# Altium footprint library ICs.PcbLib: 86 footprints (part 2 of 6)
Each footprint in its own frame and in the unit in brackets; x right, y up, seen from the top. Pads: shape width x height; smd on the part's side, far side on the other; paste and mask are expansions set on the pad; w line width, h text height; cw(c..) or ccw(c..) is an arc to the next point about the centre after c.
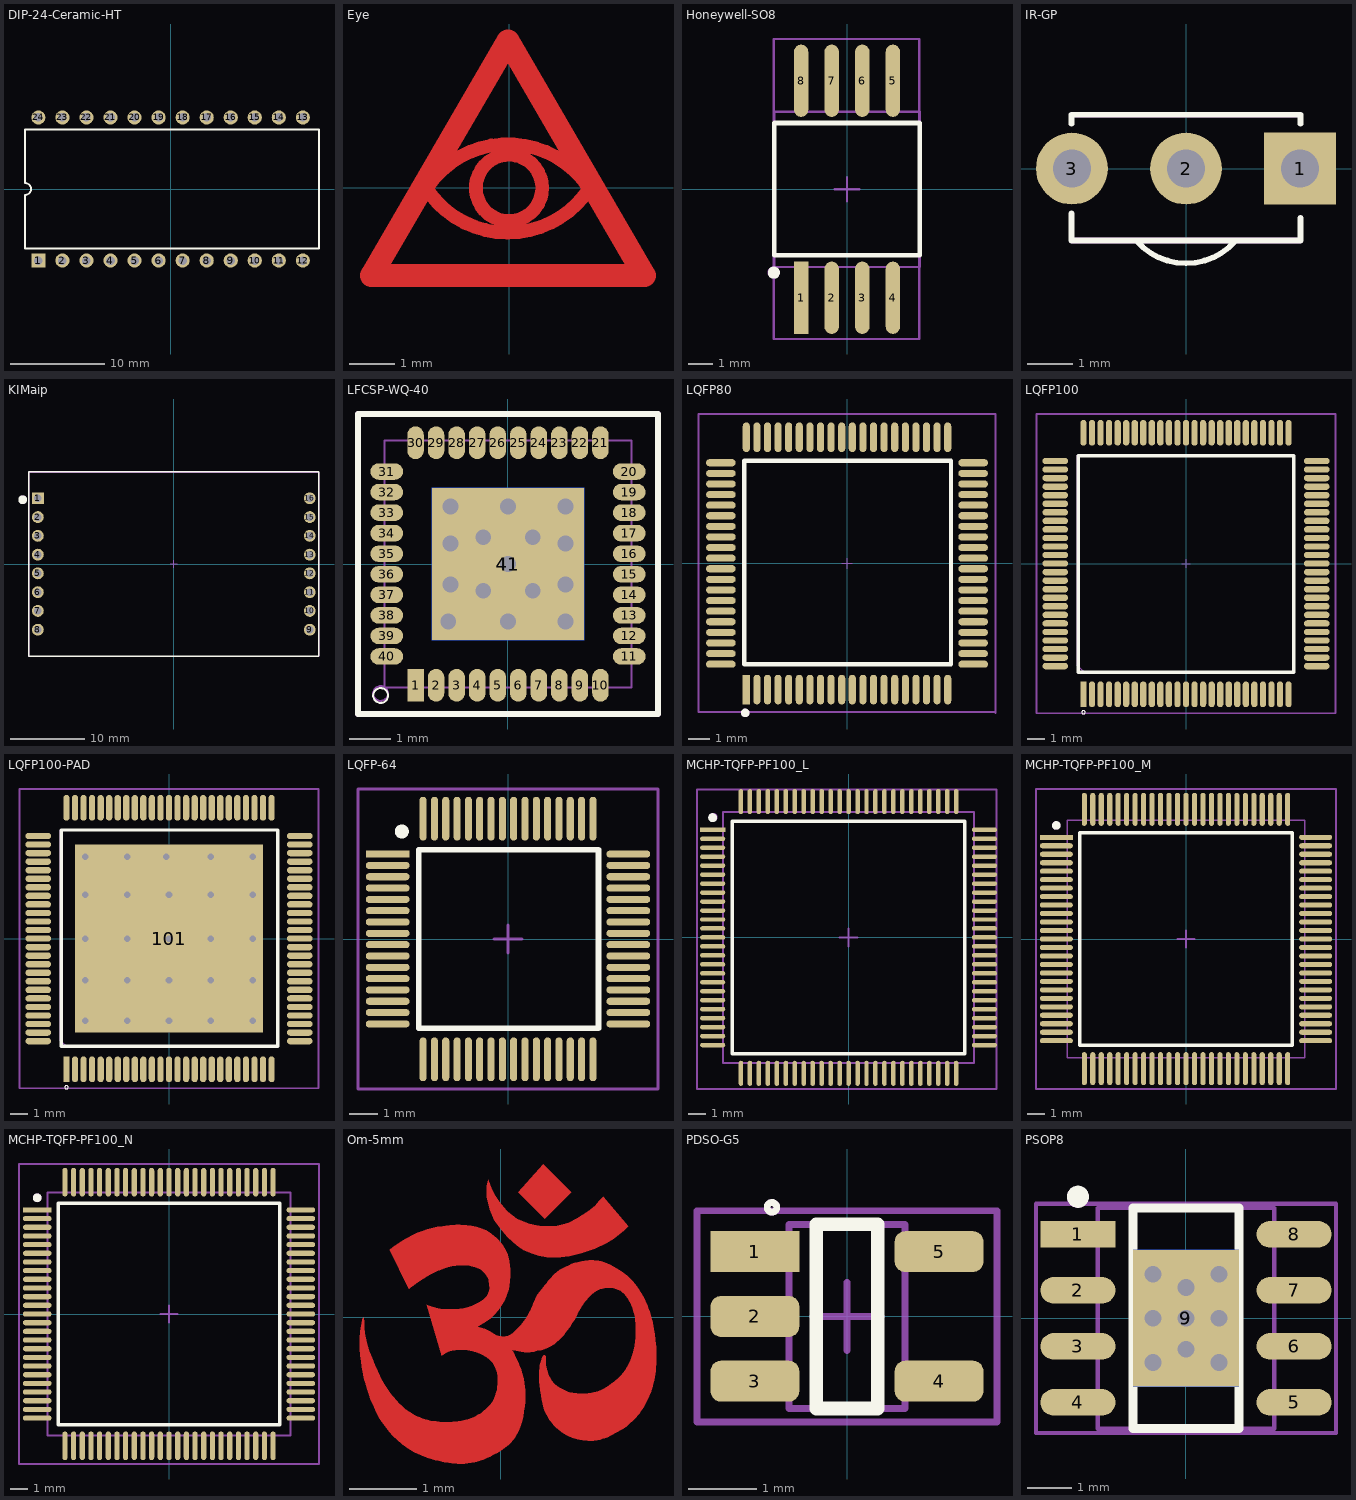
[diagram p1: the footprints below, top view; thin cyan lines are the x and y axes]

## DIP-24-Ceramic-HT [mm] "DIP; 24 Leads; Row Spacing 7.62 mm; Pitch 2.54 mm"
height 5.08
pads (24):
  rect 1.5x1.5 hole 0.9: 1(-13.97,-7.555)
  round 1.5 hole 0.9: 2(-11.43,-7.555) 3(-8.89,-7.555) 4(-6.35,-7.555) 5(-3.81,-7.555) 6(-1.27,-7.555) 7(1.27,-7.555) 8(3.81,-7.555) 9(6.35,-7.555) 10(8.89,-7.555) 11(11.43,-7.555) 12(13.97,-7.555) 13(13.97,7.555) 14(11.43,7.555) 15(8.89,7.555) 16(6.35,7.555) 17(3.81,7.555) 18(1.27,7.555) 19(-1.27,7.555) 20(-3.81,7.555) 21(-6.35,7.555) 22(-8.89,7.555) 23(-11.43,7.555) 24(-13.97,7.555)
Top Overlay:
  lines w0.2: -15.38,-0.665 -15.38,-6.27 15.675,-6.27 15.675,6.275 -15.38,6.275 -15.38,0.65 ; -15.38,-0.635 ccw(c-15.38,0) -15.38,0.635
3D body "dip24_6.stp": height 6, standoff -2.38, extent -16.486,-8.032 16.546,8.032

## Eye [mm]
Top Layer:
  circle w0.3: c-0.005,-0.005 r0.728
  lines w0.3: -1.862,0.058 ccw(c-0.03,1.138) 1.792,0.042 ; -1.796,0.014 cw(c-0.03,-1.17) 1.74,0.007
  lines w0.5: -3.03,-1.93 -0.025,3.225 2.97,-1.93 -3.03,-1.93
Top Solder:
  circle w0.3: c0,-0.03 r0.728
  lines w0.3: -1.857,0.033 ccw(c-0.025,1.113) 1.797,0.017 ; -1.791,-0.011 cw(c-0.025,-1.195) 1.745,-0.018
  lines w0.55: -3.025,-1.955 2.975,-1.955 -0.02,3.2 -3.025,-1.955

## Honeywell-SO8 [mm] "Honeywell-SO8"
height 1.75
pads (8):
  rect 0.6x3 smd: 1(-1.905,-4.5)
  oval 0.6x3 smd: 2(-0.635,-4.5) 3(0.635,-4.5) 4(1.905,-4.5) 5(1.905,4.5) 6(0.635,4.5) 7(-0.635,4.5) 8(-1.905,4.5)
Top Overlay:
  circle w0.25: c-3.035,-3.46 r0.125
  lines w0.2: -3.02,-2.735 -3.02,2.745 3.02,2.745 3.02,-2.735 -3.02,-2.735
Mechanical 1:
  circle w0.1: c-3.045,-3.45 r0.2
  lines w0.1: -3.02,-3.225 -3.02,3.22 3.01,3.22 3.01,-3.225 -3.02,-3.225
Mechanical 15:
  lines w0.1: -0.5,0 0.5,0 ; 0,-0.5 0,0.5 ; -3.045,-6.21 -3.045,6.23 2.995,6.23 2.995,-6.21 -3.045,-6.21
3D body: height 3, standoff 1, extent -3.035,-3.205 2.995,3.215

## IR-GP [mm]
height 7.5
pads (3):
  rect 1.6x1.6 hole 0.85: 1(2.54,0)
  round 1.6 hole 0.85: 2(0,0) 3(-2.54,0)
Top Overlay:
  lines w0.127: -2.55,-1 -2.55,-1.6 2.55,-1.6 2.55,-1.1 ; -2.55,1 -2.55,1.2 2.55,1.2 2.55,1 ; -1.11,-1.6 ccw(c0,-0.64) 1.11,-1.6
Mechanical 1:
  lines w0.127: -2.54,-1.6 2.54,-1.6 ; -2.54,1.2 2.54,1.2
3D body: height 8, standoff 0.5, extent -2.54,-1.6 2.54,1.2

## KIMaip [mm]
height 8.5
pads (16):
  rect 1.6x1.6 hole 1: 1(-18.4,8.89)
  round 1.6 hole 1: 2(-18.4,6.35) 3(-18.4,3.81) 4(-18.4,1.27) 5(-18.4,-1.27) 6(-18.4,-3.81) 7(-18.4,-6.35) 8(-18.4,-8.89) 9(18.4,-8.89) 10(18.4,-6.35) 11(18.4,-3.81) 12(18.4,-1.27) 13(18.4,1.27) 14(18.4,3.81) 15(18.4,6.35) 16(18.4,8.89)
Top Overlay:
  circle w0.6: c-20.45,8.7 r0.3
  lines w0.2: 19.6,-12.5 -19.6,-12.5 -19.6,12.5 19.6,12.5 19.6,-12.45
Mechanical 13:
  circle w0.1: c-20.45,8.7 r0.5
  lines w0.1: -19.6,-12.5 -19.6,12.5 19.6,12.5 19.6,-12.5 -19.6,-12.5
Mechanical 15:
  lines w0.1: -0.5,0 0.5,0 ; 0,-0.5 0,0.5 ; -19.55,-12.5 -19.55,12.45 19.65,12.45 19.65,-12.5 -19.55,-12.5
3D body: height 3, standoff 0, extent 17.2,-12.55 19.55,12.5
3D body: height 3, standoff 0, extent -19.6,-12.5 -17.25,12.55
3D body: height 8.5, standoff 3, extent -19.6,-12.5 19.6,12.55

## LFCSP-WQ-40 [mm]
height 0.8
pads (42):
  rect 0.4x0.8 smd: 1(-2.25,-2.95)
  oval 0.4x0.8 smd: 2(-1.75,-2.95) 3(-1.25,-2.95) 4(-0.75,-2.95) 5(-0.25,-2.95) 6(0.25,-2.95) 7(0.75,-2.95) 8(1.25,-2.95) 9(1.75,-2.95) 10(2.25,-2.95) 21(2.25,2.95) 22(1.75,2.95) 23(1.25,2.95) 24(0.75,2.95) 25(0.25,2.95) 26(-0.25,2.95) 27(-0.75,2.95) 28(-1.25,2.95) 29(-1.75,2.95) 30(-2.25,2.95)
  oval 0.8x0.4 smd: 11(2.95,-2.25) 12(2.95,-1.75) 13(2.95,-1.25) 14(2.95,-0.75) 15(2.95,-0.25) 16(2.95,0.25) 17(2.95,0.75) 18(2.95,1.25) 19(2.95,1.75) 20(2.95,2.25) 31(-2.95,2.25) 32(-2.95,1.75) 33(-2.95,1.25) 34(-2.95,0.75) 35(-2.95,0.25) 36(-2.95,-0.25) 37(-2.95,-0.75) 38(-2.95,-1.25) 39(-2.95,-1.75) 40(-2.95,-2.25)
  rect 3.7x3.7 smd: 41(0,0)
  rect 3.7x3.7 smd far side: 41(0,0)
via 0,0 diameter 0.6 hole 0.381
via -1.4,1.4 diameter 0.6 hole 0.381
via -1.45,-1.4 diameter 0.6 hole 0.381
via 1.4,1.4 diameter 0.6 hole 0.381
via 1.4,-1.4 diameter 0.6 hole 0.381
via 0,-1.4 diameter 0.6 hole 0.381
via 1.4,-0.5 diameter 0.6 hole 0.381
via 0,1.4 diameter 0.6 hole 0.381
via 1.4,0.5 diameter 0.6 hole 0.381
via -1.4,-0.5 diameter 0.6 hole 0.381
via -1.4,0.5 diameter 0.6 hole 0.381
via -0.6,-0.65 diameter 0.6 hole 0.381
via -0.6,0.65 diameter 0.6 hole 0.381
via 0.6,0.65 diameter 0.6 hole 0.381
via 0.6,-0.65 diameter 0.6 hole 0.381
Top Overlay:
  circle w0.05: c-3.1,-3.2 r0.18
  lines w0.15: -3.65,-3.65 -3.65,3.65 3.65,3.65 3.65,-3.65 -3.65,-3.65
Mechanical 1:
  lines w0.05: -3,-3 -3,3 3,3 3,-3 -3,-3
Mechanical 15:
  circle w0.05: c-3.1,-3.15 r0.18
  lines w0.05: -0.5,0 0.5,0 ; 0,-0.5 0,0.5
  lines w0.15: -3.65,-3.65 3.65,-3.65 3.65,3.65 -3.65,3.65 -3.65,-3.65
3D body: height 0.8, standoff 0, extent -3,-3 3,3

## LQFP80 [mm]
pads (80):
  rect 0.335x1.4 smd: 1(-4.75,-5.95)
  oval 0.335x1.4 smd: 2(-4.25,-5.95) 3(-3.75,-5.95) 4(-3.25,-5.95) 5(-2.75,-5.95) 6(-2.25,-5.95) 7(-1.75,-5.95) 8(-1.25,-5.95) 9(-0.75,-5.95) 10(-0.25,-5.95) 11(0.25,-5.95) 12(0.75,-5.95) 13(1.25,-5.95) 14(1.75,-5.95) 15(2.25,-5.95) 16(2.75,-5.95) 17(3.25,-5.95) 18(3.75,-5.95) 19(4.25,-5.95) 20(4.75,-5.95) 41(4.75,5.95) 42(4.25,5.95) 43(3.75,5.95) 44(3.25,5.95) 45(2.75,5.95) 46(2.25,5.95) 47(1.75,5.95) 48(1.25,5.95) 49(0.75,5.95) 50(0.25,5.95) 51(-0.25,5.95) 52(-0.75,5.95) 53(-1.25,5.95) 54(-1.75,5.95) 55(-2.25,5.95) 56(-2.75,5.95) 57(-3.25,5.95) 58(-3.75,5.95) 59(-4.25,5.95) 60(-4.75,5.95)
  oval 1.4x0.335 smd: 21(5.95,-4.75) 22(5.95,-4.25) 23(5.95,-3.75) 24(5.95,-3.25) 25(5.95,-2.75) 26(5.95,-2.25) 27(5.95,-1.75) 28(5.95,-1.25) 29(5.95,-0.75) 30(5.95,-0.25) 31(5.95,0.25) 32(5.95,0.75) 33(5.95,1.25) 34(5.95,1.75) 35(5.95,2.25) 36(5.95,2.75) 37(5.95,3.25) 38(5.95,3.75) 39(5.95,4.25) 40(5.95,4.75) 61(-5.95,4.75) 62(-5.95,4.25) 63(-5.95,3.75) 64(-5.95,3.25) 65(-5.95,2.75) 66(-5.95,2.25) 67(-5.95,1.75) 68(-5.95,1.25) 69(-5.95,0.75) 70(-5.95,0.25) 71(-5.95,-0.25) 72(-5.95,-0.75) 73(-5.95,-1.25) 74(-5.95,-1.75) 75(-5.95,-2.25) 76(-5.95,-2.75) 77(-5.95,-3.25) 78(-5.95,-3.75) 79(-5.95,-4.25) 80(-5.95,-4.75)
Top Overlay:
  circle w0.3: c-4.8,-7.05 r0.05
  lines w0.2: -4.85,-4.75 -4.85,4.85 4.9,4.85 4.9,-4.75 -4.85,-4.75
Mechanical 1:
  lines w0.05: -4.85,-4.75 4.9,-4.75 4.9,4.85 -4.85,4.85 -4.85,-4.75
Mechanical 15:
  lines w0.05: -0.25,0 0.25,0 ; 0,-0.25 0,0.25
  lines w0.1: 7,-7.05 7,7.05 -7,7.05 -7,-7 7,-7
  lines w0.3: -4.8,-7.1 cw(c-4.8,-7.05) -4.77,-7.09
3D body: height 0.6, standoff 0, extent -4.85,-4.75 4.9,4.85

## LQFP100 [mm]
pads (100):
  rect 0.37x1.5 smd: 1(-6,-7.65)
  oval 0.37x1.5 smd: 2(-5.5,-7.65) 3(-5,-7.65) 4(-4.5,-7.65) 5(-4,-7.65) 6(-3.5,-7.65) 7(-3,-7.65) 8(-2.5,-7.65) 9(-2,-7.65) 10(-1.5,-7.65) 11(-1,-7.65) 12(-0.5,-7.65) 13(0,-7.65) 14(0.5,-7.65) 15(1,-7.65) 16(1.5,-7.65) 17(2,-7.65) 18(2.5,-7.65) 19(3,-7.65) 20(3.5,-7.65) 21(4,-7.65) 22(4.5,-7.65) 23(5,-7.65) 24(5.5,-7.65) 25(6,-7.65) 51(6,7.65) 52(5.5,7.65) 53(5,7.65) 54(4.5,7.65) 55(4,7.65) 56(3.5,7.65) 57(3,7.65) 58(2.5,7.65) 59(2,7.65) 60(1.5,7.65) 61(1,7.65) 62(0.5,7.65) 63(0,7.65) 64(-0.5,7.65) 65(-1,7.65) 66(-1.5,7.65) 67(-2,7.65) 68(-2.5,7.65) 69(-3,7.65) 70(-3.5,7.65) 71(-4,7.65) 72(-4.5,7.65) 73(-5,7.65) 74(-5.5,7.65) 75(-6,7.65)
  oval 1.5x0.37 smd: 26(7.65,-6) 27(7.65,-5.5) 28(7.65,-5) 29(7.65,-4.5) 30(7.65,-4) 31(7.65,-3.5) 32(7.65,-3) 33(7.65,-2.5) 34(7.65,-2) 35(7.65,-1.5) 36(7.65,-1) 37(7.65,-0.5) 38(7.65,0) 39(7.65,0.5) 40(7.65,1) 41(7.65,1.5) 42(7.65,2) 43(7.65,2.5) 44(7.65,3) 45(7.65,3.5) 46(7.65,4) 47(7.65,4.5) 48(7.65,5) 49(7.65,5.5) 50(7.65,6) 76(-7.65,6) 77(-7.65,5.5) 78(-7.65,5) 79(-7.65,4.5) 80(-7.65,4) 81(-7.65,3.5) 82(-7.65,3) 83(-7.65,2.5) 84(-7.65,2) 85(-7.65,1.5) 86(-7.65,1) 87(-7.65,0.5) 88(-7.65,0) 89(-7.65,-0.5) 90(-7.65,-1) 91(-7.65,-1.5) 92(-7.65,-2) 93(-7.65,-2.5) 94(-7.65,-3) 95(-7.65,-3.5) 96(-7.65,-4) 97(-7.65,-4.5) 98(-7.65,-5) 99(-7.65,-5.5) 100(-7.65,-6)
Top Overlay:
  circle w0.05: c-6,-8.7 r0.1
  lines w0.2: -6.3,-6.35 -6.3,6.3 6.3,6.3 6.3,-6.35 -6.3,-6.35
Mechanical 1:
  lines w0.05: -6.35,-5.95 -5.95,-6.35 6.35,-6.35 6.35,6.35 -6.35,6.35 -6.35,-5.95
Mechanical 15:
  circle w0.05: c-6,-8.7 r0.1
  lines w0.05: -0.25,0 0.25,0 ; 0,-0.25 0,0.25 ; -8.75,-8.75 -8.75,8.75 8.75,8.75 8.75,-8.75 -8.75,-8.75
  lines w0.1: -8.75,-8.75 -8.75,8.75 8.75,8.75 8.75,-8.75 -8.75,-8.75
3D body: height 1, standoff 0, extent -6.35,-6.35 6.35,6.35

## LQFP100-PAD [mm]
pads (101):
  rect 0.37x1.5 smd: 1(-6,-7.65)
  oval 0.37x1.5 smd: 2(-5.5,-7.65) 3(-5,-7.65) 4(-4.5,-7.65) 5(-4,-7.65) 6(-3.5,-7.65) 7(-3,-7.65) 8(-2.5,-7.65) 9(-2,-7.65) 10(-1.5,-7.65) 11(-1,-7.65) 12(-0.5,-7.65) 13(0,-7.65) 14(0.5,-7.65) 15(1,-7.65) 16(1.5,-7.65) 17(2,-7.65) 18(2.5,-7.65) 19(3,-7.65) 20(3.5,-7.65) 21(4,-7.65) 22(4.5,-7.65) 23(5,-7.65) 24(5.5,-7.65) 25(6,-7.65) 51(6,7.65) 52(5.5,7.65) 53(5,7.65) 54(4.5,7.65) 55(4,7.65) 56(3.5,7.65) 57(3,7.65) 58(2.5,7.65) 59(2,7.65) 60(1.5,7.65) 61(1,7.65) 62(0.5,7.65) 63(0,7.65) 64(-0.5,7.65) 65(-1,7.65) 66(-1.5,7.65) 67(-2,7.65) 68(-2.5,7.65) 69(-3,7.65) 70(-3.5,7.65) 71(-4,7.65) 72(-4.5,7.65) 73(-5,7.65) 74(-5.5,7.65) 75(-6,7.65)
  oval 1.5x0.37 smd: 26(7.65,-6) 27(7.65,-5.5) 28(7.65,-5) 29(7.65,-4.5) 30(7.65,-4) 31(7.65,-3.5) 32(7.65,-3) 33(7.65,-2.5) 34(7.65,-2) 35(7.65,-1.5) 36(7.65,-1) 37(7.65,-0.5) 38(7.65,0) 39(7.65,0.5) 40(7.65,1) 41(7.65,1.5) 42(7.65,2) 43(7.65,2.5) 44(7.65,3) 45(7.65,3.5) 46(7.65,4) 47(7.65,4.5) 48(7.65,5) 49(7.65,5.5) 50(7.65,6) 76(-7.65,6) 77(-7.65,5.5) 78(-7.65,5) 79(-7.65,4.5) 80(-7.65,4) 81(-7.65,3.5) 82(-7.65,3) 83(-7.65,2.5) 84(-7.65,2) 85(-7.65,1.5) 86(-7.65,1) 87(-7.65,0.5) 88(-7.65,0) 89(-7.65,-0.5) 90(-7.65,-1) 91(-7.65,-1.5) 92(-7.65,-2) 93(-7.65,-2.5) 94(-7.65,-3) 95(-7.65,-3.5) 96(-7.65,-4) 97(-7.65,-4.5) 98(-7.65,-5) 99(-7.65,-5.5) 100(-7.65,-6)
  rect 11x11 smd: 101(0,0)
via 2.45,0 diameter 0.6 hole 0.381
via 2.45,2.56 diameter 0.6 hole 0.381
via -2.45,2.56 diameter 0.6 hole 0.381
via -2.45,0 diameter 0.6 hole 0.381
via -2.45,-2.45 diameter 0.6 hole 0.381
via 0,-2.45 diameter 0.6 hole 0.381
via 2.45,-2.45 diameter 0.6 hole 0.381
via 4.9,2.56 diameter 0.6 hole 0.381
via 4.9,0 diameter 0.6 hole 0.381
via 4.9,-2.45 diameter 0.6 hole 0.381
via 2.45,-4.8 diameter 0.6 hole 0.381
via -2.45,-4.8 diameter 0.6 hole 0.381
via 4.9,-4.8 diameter 0.6 hole 0.381
via 0,-4.8 diameter 0.6 hole 0.381
via -4.9,-4.8 diameter 0.6 hole 0.381
via -4.9,-2.45 diameter 0.6 hole 0.381
via -4.9,0 diameter 0.6 hole 0.381
via -4.9,2.56 diameter 0.6 hole 0.381
via 0,2.56 diameter 0.6 hole 0.381
via 2.45,4.8 diameter 0.6 hole 0.381
via -2.45,4.8 diameter 0.6 hole 0.381
via -4.9,4.8 diameter 0.6 hole 0.381
via 4.9,4.8 diameter 0.6 hole 0.381
via 0,0 diameter 0.6 hole 0.381
via -0.15,4.8 diameter 0.6 hole 0.381
Top Overlay:
  circle w0.05: c-6,-8.7 r0.1
  lines w0.2: -6.3,-6.3 -6.3,6.35 6.35,6.35 6.35,-6.3 -6.3,-6.3
Mechanical 1:
  lines w0.05: -6.35,-5.95 -5.95,-6.35 6.35,-6.35 6.35,6.35 -6.35,6.35 -6.35,-5.95
Mechanical 15:
  circle w0.05: c-6,-8.7 r0.1
  lines w0.05: -0.25,0 0.25,0 ; 0,-0.25 0,0.25
  lines w0.1: -8.75,-8.75 -8.75,8.75 8.75,8.75 8.75,-8.75 -8.75,-8.75
3D body: height 1, standoff 0, extent -6.35,-6.35 6.35,6.35

## LQFP-64 [mm] "64-Pin Thin Plastic Quad Flat Pack 0.5 mm Pitch, 0.4mm Lead Form, IPC High Density"
height 1.2
pads (64):
  rect 1.55x0.25 smd: 1(-4.25,3)
  oval 1.55x0.25 smd: 2(-4.25,2.6) 3(-4.25,2.2) 4(-4.25,1.8) 5(-4.25,1.4) 6(-4.25,1) 7(-4.25,0.6) 8(-4.25,0.2) 9(-4.25,-0.2) 10(-4.25,-0.6) 11(-4.25,-1) 12(-4.25,-1.4) 13(-4.25,-1.8) 14(-4.25,-2.2) 15(-4.25,-2.6) 16(-4.25,-3) 33(4.25,-3) 34(4.25,-2.6) 35(4.25,-2.2) 36(4.25,-1.8) 37(4.25,-1.4) 38(4.25,-1) 39(4.25,-0.6) 40(4.25,-0.2) 41(4.25,0.2) 42(4.25,0.6) 43(4.25,1) 44(4.25,1.4) 45(4.25,1.8) 46(4.25,2.2) 47(4.25,2.6) 48(4.25,3)
  oval 0.25x1.55 smd: 17(-3,-4.25) 18(-2.6,-4.25) 19(-2.2,-4.25) 20(-1.8,-4.25) 21(-1.4,-4.25) 22(-1,-4.25) 23(-0.6,-4.25) 24(-0.2,-4.25) 25(0.2,-4.25) 26(0.6,-4.25) 27(1,-4.25) 28(1.4,-4.25) 29(1.8,-4.25) 30(2.2,-4.25) 31(2.6,-4.25) 32(3,-4.25) 49(3,4.25) 50(2.6,4.25) 51(2.2,4.25) 52(1.8,4.25) 53(1.4,4.25) 54(1,4.25) 55(0.6,4.25) 56(0.2,4.25) 57(-0.2,4.25) 58(-0.6,4.25) 59(-1,4.25) 60(-1.4,4.25) 61(-1.8,4.25) 62(-2.2,4.25) 63(-2.6,4.25) 64(-3,4.25)
Top Overlay:
  circle w0.25: c-3.75,3.8 r0.125
  lines w0.2: -3.15,-3.15 3.2,-3.15 3.2,3.15 -3.15,3.15 -3.15,-3.15
Mechanical 1:
  circle w0.1: c-3.8,3.8 r0.15
  lines w0.1: -3.15,-3.15 3.2,-3.15 3.2,3.15 -3.15,3.15 -3.15,-3.15
Mechanical 15:
  lines w0.1: -0.5,0 0.5,0 ; 0,-0.5 0,0.5 ; -5.3,-5.3 5.3,-5.3 5.3,5.3 -5.3,5.3 -5.3,-5.3
3D body: height 0.5, standoff 0, extent -3.15,-3.15 3.15,3.15

## MCHP-TQFP-PF100_L [mm] "QFP, 100-Leads, Body 14x14mm, Pitch 0.5mm, IPC High Density"
height 1.2
pads (100):
  rect 1.4x0.25 smd: 1(-7.575,6)
  oval 1.4x0.25 smd: 2(-7.575,5.5) 3(-7.575,5) 4(-7.575,4.5) 5(-7.575,4) 6(-7.575,3.5) 7(-7.575,3) 8(-7.575,2.5) 9(-7.575,2) 10(-7.575,1.5) 11(-7.575,1) 12(-7.575,0.5) 13(-7.575,0) 14(-7.575,-0.5) 15(-7.575,-1) 16(-7.575,-1.5) 17(-7.575,-2) 18(-7.575,-2.5) 19(-7.575,-3) 20(-7.575,-3.5) 21(-7.575,-4) 22(-7.575,-4.5) 23(-7.575,-5) 24(-7.575,-5.5) 25(-7.575,-6) 51(7.575,-6) 52(7.575,-5.5) 53(7.575,-5) 54(7.575,-4.5) 55(7.575,-4) 56(7.575,-3.5) 57(7.575,-3) 58(7.575,-2.5) 59(7.575,-2) 60(7.575,-1.5) 61(7.575,-1) 62(7.575,-0.5) 63(7.575,0) 64(7.575,0.5) 65(7.575,1) 66(7.575,1.5) 67(7.575,2) 68(7.575,2.5) 69(7.575,3) 70(7.575,3.5) 71(7.575,4) 72(7.575,4.5) 73(7.575,5) 74(7.575,5.5) 75(7.575,6)
  oval 0.25x1.4 smd: 26(-6,-7.575) 27(-5.5,-7.575) 28(-5,-7.575) 29(-4.5,-7.575) 30(-4,-7.575) 31(-3.5,-7.575) 32(-3,-7.575) 33(-2.5,-7.575) 34(-2,-7.575) 35(-1.5,-7.575) 36(-1,-7.575) 37(-0.5,-7.575) 38(0,-7.575) 39(0.5,-7.575) 40(1,-7.575) 41(1.5,-7.575) 42(2,-7.575) 43(2.5,-7.575) 44(3,-7.575) 45(3.5,-7.575) 46(4,-7.575) 47(4.5,-7.575) 48(5,-7.575) 49(5.5,-7.575) 50(6,-7.575) 76(6,7.575) 77(5.5,7.575) 78(5,7.575) 79(4.5,7.575) 80(4,7.575) 81(3.5,7.575) 82(3,7.575) 83(2.5,7.575) 84(2,7.575) 85(1.5,7.575) 86(1,7.575) 87(0.5,7.575) 88(0,7.575) 89(-0.5,7.575) 90(-1,7.575) 91(-1.5,7.575) 92(-2,7.575) 93(-2.5,7.575) 94(-3,7.575) 95(-3.5,7.575) 96(-4,7.575) 97(-4.5,7.575) 98(-5,7.575) 99(-5.5,7.575) 100(-6,7.575)
Top Overlay:
  circle w0.25: c-7.575,6.675 r0.125
  lines w0.2: -6.475,-6.475 -6.475,6.475 6.475,6.475 6.475,-6.475 -6.475,-6.475
Mechanical 1:
  circle w0.1: c-7.55,6.7 r0.2
  lines w0.1: -7,-7 -7,7 7,7 7,-7 -7,-7
Mechanical 15:
  lines w0.1: -0.5,0 0.5,0 ; 0,-0.5 0,0.5 ; -8.45,-8.45 -8.45,8.25 8.25,8.25 8.25,-8.45 -8.45,-8.45
3D body "tqfp100_14x14.stp": height 1.5, standoff 0, extent -8,-8 8,8

## MCHP-TQFP-PF100_M [mm] "QFP, 100-Leads, Body 14x14mm, Pitch 0.5mm, IPC Low Density"
height 1.2
pads (100):
  rect 1.95x0.3 smd: 1(-7.65,6)
  oval 1.95x0.3 smd: 2(-7.65,5.5) 3(-7.65,5) 4(-7.65,4.5) 5(-7.65,4) 6(-7.65,3.5) 7(-7.65,3) 8(-7.65,2.5) 9(-7.65,2) 10(-7.65,1.5) 11(-7.65,1) 12(-7.65,0.5) 13(-7.65,0) 14(-7.65,-0.5) 15(-7.65,-1) 16(-7.65,-1.5) 17(-7.65,-2) 18(-7.65,-2.5) 19(-7.65,-3) 20(-7.65,-3.5) 21(-7.65,-4) 22(-7.65,-4.5) 23(-7.65,-5) 24(-7.65,-5.5) 25(-7.65,-6) 51(7.65,-6) 52(7.65,-5.5) 53(7.65,-5) 54(7.65,-4.5) 55(7.65,-4) 56(7.65,-3.5) 57(7.65,-3) 58(7.65,-2.5) 59(7.65,-2) 60(7.65,-1.5) 61(7.65,-1) 62(7.65,-0.5) 63(7.65,0) 64(7.65,0.5) 65(7.65,1) 66(7.65,1.5) 67(7.65,2) 68(7.65,2.5) 69(7.65,3) 70(7.65,3.5) 71(7.65,4) 72(7.65,4.5) 73(7.65,5) 74(7.65,5.5) 75(7.65,6)
  oval 0.3x1.95 smd: 26(-6,-7.65) 27(-5.5,-7.65) 28(-5,-7.65) 29(-4.5,-7.65) 30(-4,-7.65) 31(-3.5,-7.65) 32(-3,-7.65) 33(-2.5,-7.65) 34(-2,-7.65) 35(-1.5,-7.65) 36(-1,-7.65) 37(-0.5,-7.65) 38(0,-7.65) 39(0.5,-7.65) 40(1,-7.65) 41(1.5,-7.65) 42(2,-7.65) 43(2.5,-7.65) 44(3,-7.65) 45(3.5,-7.65) 46(4,-7.65) 47(4.5,-7.65) 48(5,-7.65) 49(5.5,-7.65) 50(6,-7.65) 76(6,7.65) 77(5.5,7.65) 78(5,7.65) 79(4.5,7.65) 80(4,7.65) 81(3.5,7.65) 82(3,7.65) 83(2.5,7.65) 84(2,7.65) 85(1.5,7.65) 86(1,7.65) 87(0.5,7.65) 88(0,7.65) 89(-0.5,7.65) 90(-1,7.65) 91(-1.5,7.65) 92(-2,7.65) 93(-2.5,7.65) 94(-3,7.65) 95(-3.5,7.65) 96(-4,7.65) 97(-4.5,7.65) 98(-5,7.65) 99(-5.5,7.65) 100(-6,7.65)
Top Overlay:
  circle w0.25: c-7.65,6.7 r0.125
  lines w0.2: -6.275,-6.275 6.275,-6.275 6.275,6.275 -6.275,6.275 -6.275,-6.275
Mechanical 13:
  circle w0.1: c-7.65,6.7 r0.2
  lines w0.1: -7,-7 7,-7 7,7 -7,7 -7,-7
Mechanical 15:
  lines w0.1: -0.5,0 0.5,0 ; 0,-0.5 0,0.5 ; -8.85,-8.85 8.85,-8.85 8.85,8.85 -8.85,8.85 -8.85,-8.85
3D body "tqfp100_14x14.stp": height 1.5, standoff 0, extent -8,-8 8,8

## MCHP-TQFP-PF100_N [mm] "QFP, 100-Leads, Body 14x14mm, Pitch 0.5mm, IPC Medium Density"
height 1.2
pads (100):
  rect 1.65x0.3 smd: 1(-7.6,6)
  oval 1.65x0.3 smd: 2(-7.6,5.5) 3(-7.6,5) 4(-7.6,4.5) 5(-7.6,4) 6(-7.6,3.5) 7(-7.6,3) 8(-7.6,2.5) 9(-7.6,2) 10(-7.6,1.5) 11(-7.6,1) 12(-7.6,0.5) 13(-7.6,0) 14(-7.6,-0.5) 15(-7.6,-1) 16(-7.6,-1.5) 17(-7.6,-2) 18(-7.6,-2.5) 19(-7.6,-3) 20(-7.6,-3.5) 21(-7.6,-4) 22(-7.6,-4.5) 23(-7.6,-5) 24(-7.6,-5.5) 25(-7.6,-6) 51(7.6,-6) 52(7.6,-5.5) 53(7.6,-5) 54(7.6,-4.5) 55(7.6,-4) 56(7.6,-3.5) 57(7.6,-3) 58(7.6,-2.5) 59(7.6,-2) 60(7.6,-1.5) 61(7.6,-1) 62(7.6,-0.5) 63(7.6,0) 64(7.6,0.5) 65(7.6,1) 66(7.6,1.5) 67(7.6,2) 68(7.6,2.5) 69(7.6,3) 70(7.6,3.5) 71(7.6,4) 72(7.6,4.5) 73(7.6,5) 74(7.6,5.5) 75(7.6,6)
  oval 0.3x1.65 smd: 26(-6,-7.6) 27(-5.5,-7.6) 28(-5,-7.6) 29(-4.5,-7.6) 30(-4,-7.6) 31(-3.5,-7.6) 32(-3,-7.6) 33(-2.5,-7.6) 34(-2,-7.6) 35(-1.5,-7.6) 36(-1,-7.6) 37(-0.5,-7.6) 38(0,-7.6) 39(0.5,-7.6) 40(1,-7.6) 41(1.5,-7.6) 42(2,-7.6) 43(2.5,-7.6) 44(3,-7.6) 45(3.5,-7.6) 46(4,-7.6) 47(4.5,-7.6) 48(5,-7.6) 49(5.5,-7.6) 50(6,-7.6) 76(6,7.6) 77(5.5,7.6) 78(5,7.6) 79(4.5,7.6) 80(4,7.6) 81(3.5,7.6) 82(3,7.6) 83(2.5,7.6) 84(2,7.6) 85(1.5,7.6) 86(1,7.6) 87(0.5,7.6) 88(0,7.6) 89(-0.5,7.6) 90(-1,7.6) 91(-1.5,7.6) 92(-2,7.6) 93(-2.5,7.6) 94(-3,7.6) 95(-3.5,7.6) 96(-4,7.6) 97(-4.5,7.6) 98(-5,7.6) 99(-5.5,7.6) 100(-6,7.6)
Top Overlay:
  circle w0.25: c-7.6,6.7 r0.125
  lines w0.2: -6.375,-6.375 6.375,-6.375 6.375,6.375 -6.375,6.375 -6.375,-6.375
Mechanical 1:
  circle w0.1: c-7.6,6.7 r0.206
  lines w0.1: -7,-7 7,-7 7,7 -7,7 -7,-7
Mechanical 15:
  lines w0.1: -0.5,0 0.5,0 ; 0,-0.5 0,0.5 ; -8.65,-8.65 8.65,-8.65 8.65,8.65 -8.65,8.65 -8.65,-8.65
3D body "tqfp100_14x14.stp": height 1.5, standoff 0, extent -8,-8 8,8

## Om-5mm [mm]
Top Layer:
  region: 538 vertices and 0 holes, not listed, extent -2.085,-2.163 2.295,1.363
  region: 0.625,2.26 1.04,1.845 0.645,1.45 0.255,1.84
  region: -0.185,2.025 -0.21,1.935 -0.21,1.78 -0.165,1.59 -0.095,1.43 -0.01,1.31 0.09,1.185 0.18,1.105 0.27,1.03 0.34,0.985 0.445,0.94 0.555,0.905 0.68,0.885 0.77,0.88 0.88,0.885 1.01,0.9 1.185,0.94 1.385,1.01 1.555,1.09 1.665,1.16 1.82,1.285 1.88,1.34 1.51,1.78 1.455,1.715 1.39,1.645 1.29,1.565 1.21,1.51 1.125,1.46 1.005,1.395 0.89,1.36 0.8,1.34 0.72,1.34 0.62,1.34 0.525,1.355 0.42,1.38 0.32,1.415 0.235,1.455 0.165,1.5 0.095,1.56 0.04,1.62 -0.025,1.7 -0.085,1.79 -0.13,1.87 -0.155,1.945
Top Solder:
  drawing of 3 lines, arcs and shapes, not listed

## PDSO-G5 [mm]
height 1.75
pads (5):
  rect 1.3x0.6 smd: 1(-1.35,0.95)
  rrect50% 1.3x0.6 smd: 2(-1.35,0) 3(-1.35,-0.95) 4(1.35,-0.95) 5(1.35,0.95)
Top Overlay:
  circle w0.1: c-1.1,1.6 r0.071
  lines w0.2: -0.45,-1.35 -0.45,1.35 0.45,1.35 0.45,-1.35 -0.45,-1.35
Mechanical 1:
  circle w0.1: c-1.1,1.6 r0.071
  lines w0.1: -0.85,-1.35 -0.85,1.35 0.85,1.35 0.85,-1.35 -0.85,-1.35
Mechanical 15:
  lines w0.1: -0.5,0 0.5,0 ; 0,-0.5 0,0.5 ; -2.2,-1.55 -2.2,1.55 2.2,1.55 2.2,-1.55 -2.2,-1.55
3D body: height 0.7, standoff 0, extent -0.85,-1.35 0.85,1.35

## PSOP8 [mm] "SOIC, 8-Leads, Body 4.9x3.9mm, Pitch 1.27mm, IPC High Density"
height 1.75
pads (10):
  rect 1.7x0.6 smd: 1(-2.45,1.905)
  oval 1.7x0.6 smd: 2(-2.45,0.635) 3(-2.45,-0.635) 4(-2.45,-1.905) 5(2.45,-1.905) 6(2.45,-0.635) 7(2.45,0.635) 8(2.45,1.905)
  rect 2.4x3.1 smd: 9(0,0)
  rect 2.4x3.1 smd far side: 9(0,0)
via 0,0 diameter 0.6 hole 0.381
via -0.75,1 diameter 0.6 hole 0.381
via -0.75,-1 diameter 0.6 hole 0.381
via 0.75,-1 diameter 0.6 hole 0.381
via 0.75,1 diameter 0.6 hole 0.381
via -0.75,0 diameter 0.6 hole 0.381
via 0.75,0 diameter 0.6 hole 0.381
via 0,0.7 diameter 0.6 hole 0.381
via 0,-0.7 diameter 0.6 hole 0.381
Top Overlay:
  circle w0.25: c-2.45,2.755 r0.125
  lines w0.2: -1.2,-2.5 -1.2,2.5 1.2,2.5 1.2,-2.5 -1.2,-2.5
Mechanical 1:
  circle w0.1: c-2.45,2.75 r0.2
  lines w0.1: -2,-2.5 -2,2.5 2,2.5 2,-2.5 -2,-2.5
Mechanical 15:
  lines w0.1: -0.5,0 0.5,0 ; 0,-0.5 0,0.5 ; -3.4,-2.6 -3.4,2.6 3.4,2.6 3.4,-2.6 -3.4,-2.6
3D body "soic-8-n.stp": height 2.05, standoff 0.05, extent -3.04,-2.5 3.04,2.5